# Altium footprint library ParsaLibrary.PcbLib: 526 footprints (part 4 of 33)
Each footprint in its own frame and in the unit in brackets; x right, y up, seen from the top. Pads: shape width x height; smd on the part's side, far side on the other; paste and mask are expansions set on the pad; w line width, h text height; cw(c..) or ccw(c..) is an arc to the next point about the centre after c.
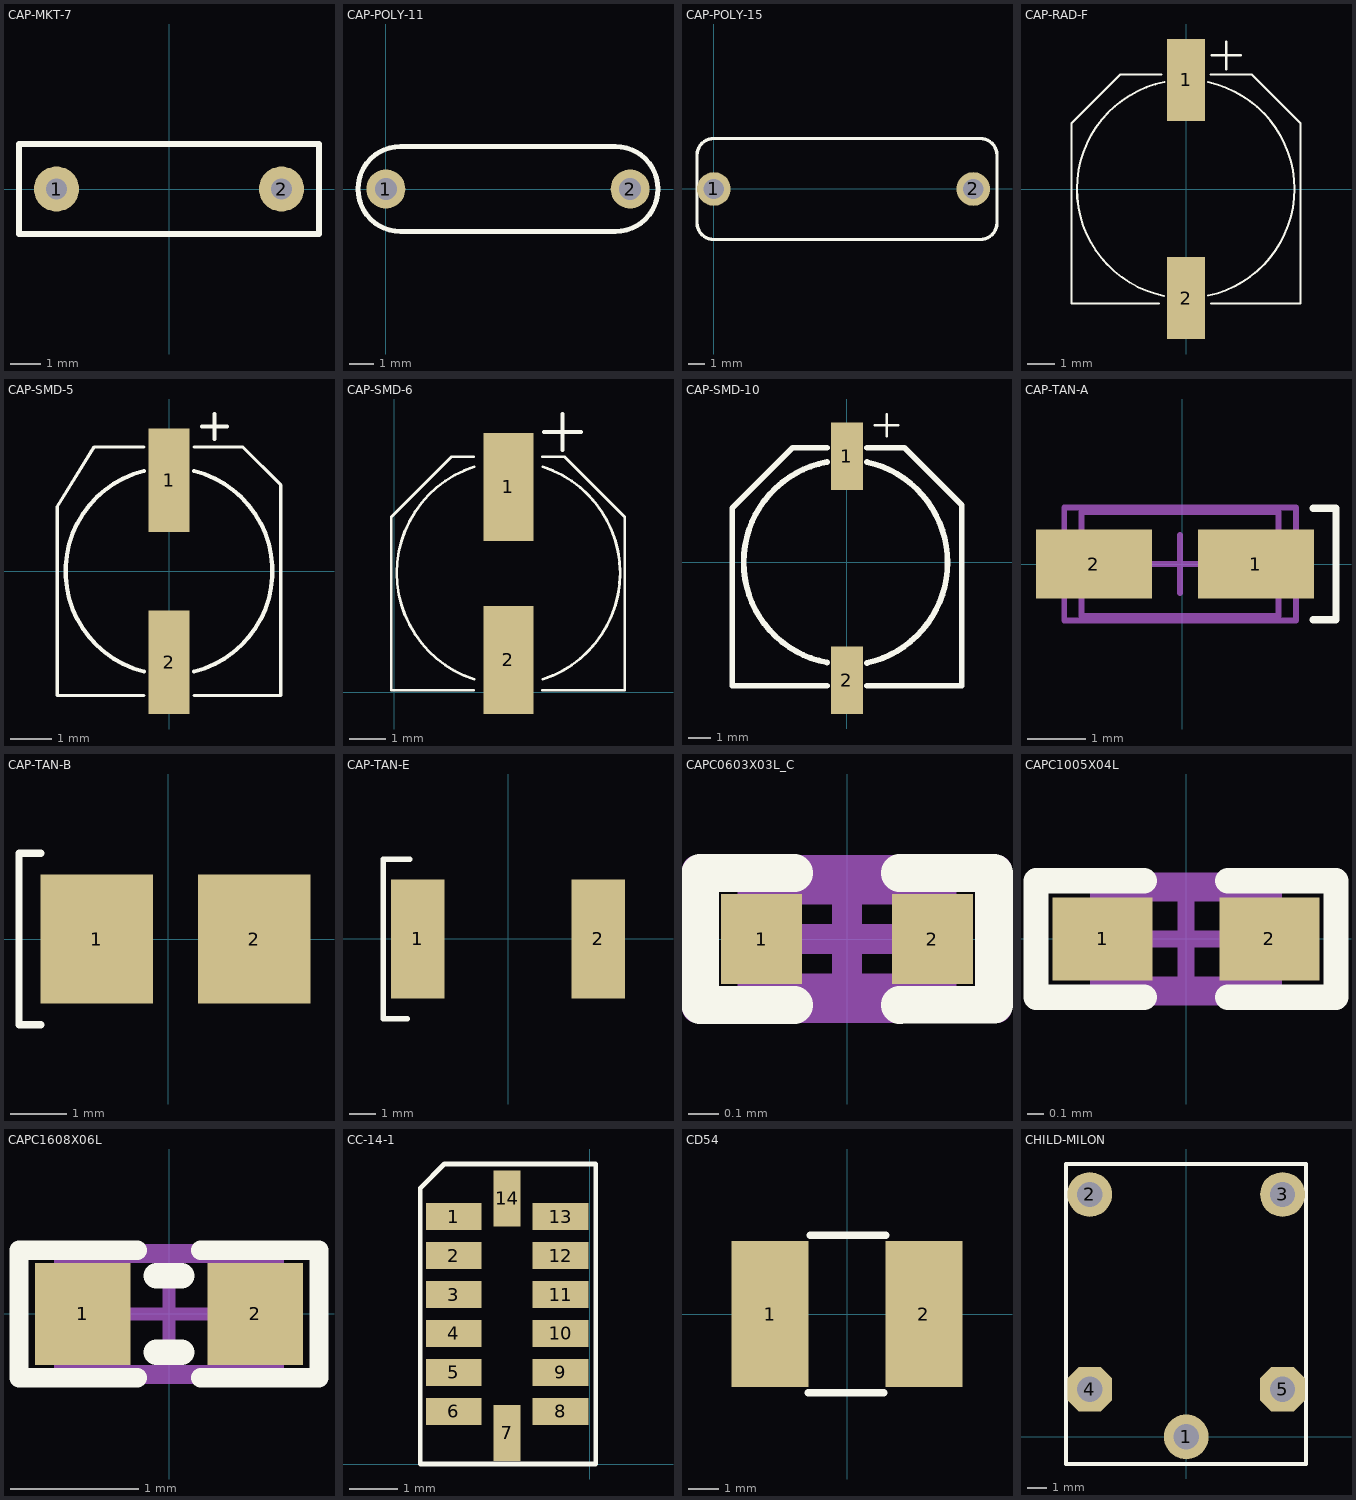
[diagram p3: the footprints below, top view; thin cyan lines are the x and y axes]

## CAP-MKT-7 [mm]
pads (2):
  round 1.5 hole 0.7: 1(-3.75,0) 2(3.75,0)
Top Overlay:
  lines w0.2: -5,-1.5 -5,1.5 5,1.5 5,-1.5 -5,-1.5
3D body: height 8, standoff 0, extent -5,-1.5 5,1.5

## CAP-POLY-11 [mm]
pads (2):
  round 1.6 hole 0.9: 1(0,0) 2(10,0)
Top Overlay:
  lines w0.2: 0.6,-1.738 cw(c0.6,0) 0.6,1.738 9.4,1.738 cw(c9.4,0) 9.4,-1.738 0.6,-1.738
3D body "__-6.STEP": height 11, standoff -3, extent -0.5,-1.75 10.5,1.75

## CAP-POLY-15 [mm]
pads (2):
  round 2 hole 1.2: 1(0,0) 2(15.4,0)
Top Overlay:
  lines w0.2: 15.811,-3.001 ccw(c15.811,-2.001) 16.811,-2.001 16.811,1.999 ccw(c15.811,1.999) 15.811,2.999 ; 15.811,-3 0,-3 cw(c0,-2) -1,-2 -1,2 cw(c0,2) 0,3 15.811,3
3D body "Part1.STEP": height 11, standoff -3, extent -0.403,-2.895 15.997,2.905

## CAP-RAD-F [mil]
pads (2):
  rect 55x118 smd: 1(0,157.48) 2(0,-157.48)
Top Overlay:
  lines w3: -38.98,-165.35 -165.35,-165.35 -165.35,94.49 -94.49,165.35 -35.43,165.35 ; -31.64,-154.27 cw(c0,0) -30.88,154.42 ; 31.59,-154 ccw(c-0.98,0.08) 31.62,154.15 ; 35.43,165.35 94.49,165.35 165.35,94.49 165.35,-165.35 36.02,-165.35
  lines w3.94: 37.4,192.91 78.74,192.91 ; 58.07,173.23 58.07,212.6
3D body "User Library-capacitor size F.step": height 401.77, standoff -0.2, extent -163.39,-194.89 163.38,194.88

## CAP-SMD-5 [mm]
pads (2):
  rect 1x2.5 smd: 1(0,2.2) 2(0,-2.2)
Top Overlay:
  lines w0.076: -0.6,-3 -2.7,-3 -2.7,1.562 ; -0.6,3 -1.813,3 ; 0.6,-3 2.7,-3 2.7,2.088 ; 0.6,3 1.788,3 ; -2.7,1.562 -1.813,3 ; -2.7,1.562 -1.813,3 ; 1.788,3 2.7,2.088 ; 1.788,3 2.7,2.088
  lines w0.1: -0.606,-2.425 cw(c0,0) -0.606,2.425 ; 0.606,-2.425 ccw(c0,0) 0.606,2.425 ; 0.8,3.5 1.4,3.5 ; 1.1,3.2 1.1,3.8
3D body "User Library-CAP SMD SVP 5_0x5_9.STEP": height 5.9, standoff 0, extent -2.65,-3 2.65,3

## CAP-SMD-6 [mil]
pads (2):
  rect 55x118 smd: 1(125,224) 2(125,35)
Top Overlay:
  lines w3: 87,2 -3,2 ; 87,257 63,257 ; 87.6,13.87 cw(c125,130) 87.6,246.13 ; 162,2 252,2 ; 162,257 186,257 ; 162.4,13.87 ccw(c125,130) 162.4,246.13 ; -3,2 -3,191 ; -3,2 -3,191 ; -3,191 63,257 ; -3,191 63,257 ; 186,257 252,191 ; 186,257 252,191 ; 252,2 252,191 ; 252,2 252,191
  lines w3.94: 163.39,284.02 204.72,284.02 ; 184.06,264.33 184.06,303.7
3D body "CAP-POL6.STEP": height 215.27, standoff 0.31, extent 5,-9.6 243.19,269.6

## CAP-SMD-10 [mil]
pads (2):
  rect 55x118 smd: 1(0,185) 2(0,-205)
Top Overlay:
  lines w3.94: 48.39,239.02 89.72,239.02 ; 69.06,219.33 69.06,258.7
  lines w10: -35,-215 -200,-215 -200,95 -95,200 -35,200 ; -35,175 ccw(c-2.51,0.43) -34.85,-174.17 ; 35,-215 200,-215 200,100 100,200 35,200 ; 35,-175 ccw(c-4.02,0) 35,175
3D body "NICHICON_UWT1H221MNL1GS.STEP": height 401.63, standoff 0, extent -200.52,-224.14 204.99,204.99

## CAP-TAN-A [mm] "Chip Capacitor, 2-Leads, Body 3.2x1.6mm, IPC High Density, chip Tantalum"
height 1.8
pads (2):
  rect 1.999x1.199 smd: 1(1.27,0) 2(-1.53,0)
Top Overlay:
  lines w0.127: 2.258,-0.965 2.652,-0.965 2.652,0.965 2.258,0.965
Mechanical 13:
  lines w0.1: -1.741,-0.9 1.659,-0.9 1.659,0.9 -1.741,0.9 -1.741,-0.9
Mechanical 15:
  lines w0.1: -0.541,0 0.459,0 ; -0.041,-0.5 -0.041,0.5 ; -2.041,-0.975 -2.041,0.975 1.959,0.975 1.959,-0.975 -2.041,-0.975
3D body "SW3dPS-Solid Tantalum Chip Capacitor Size (A-3216-18).STEP": height 1.8, standoff 0, extent -1.94,-0.902 1.699,0.902

## CAP-TAN-B [mm]
pads (2):
  rect 2x2.3 smd: 1(-1.27,0)
  rect 1.999x2.3 smd: 2(1.53,0)
Top Overlay:
  lines w0.127: -2.258,-1.524 -2.651,-1.524 -2.651,1.524 -2.258,1.524
3D body "User Library-AVX_BCASE.step": height 2.03, standoff 0, extent -1.85,-1.465 1.85,1.465

## CAP-TAN-E [mm]
pads (2):
  rect 2x4.5 smd: 1(-3.4,0) 2(3.4,0)
Top Overlay:
  lines w0.2: -3.8,-3 -4.7,-3 -4.7,3 -3.7,3
3D body "User Library-CaseE_7260-38.step": height 3.6, standoff 0, extent -3.65,-3 3.65,3

## CAPC0603X03L_C [mm]
pads (2):
  rect 0.27x0.3 smd: 1(-0.285,0) 2(0.285,0)
Top Overlay:
  lines w0.125: -0.175,-0.22 -0.49,-0.22 -0.49,0.22 -0.175,0.22 ; 0.175,-0.22 0.49,-0.22 0.49,0.22 0.175,0.22
Mechanical 7:
  lines w0.1: -0.315,-0.165 0.315,-0.165 0.315,0.165 -0.315,0.165 -0.315,-0.165
  text ".Designator" at -0.306,0.268 h0.3
Mechanical 15:
  lines w0.1: -0.165,0 0.165,0 ; 0,-0.165 0,0.165 ; -0.5,-0.23 0.5,-0.23 0.5,0.23 -0.5,0.23 -0.5,-0.23
3D body "User Library-0201(0603M) Cap.step": height 0.3, standoff -0.01, extent -0.305,-0.152 0.305,0.153

## CAPC1005X04L [mm]
pads (2):
  rect 0.6x0.5 smd: 1(-0.5,0) 2(0.5,0)
Top Overlay:
  lines w0.152: -0.25,-0.35 -0.9,-0.35 -0.9,0.35 -0.25,0.35 ; 0.25,-0.35 0.9,-0.35 0.9,0.35 0.25,0.35
Mechanical 7:
  lines w0.1: -0.525,-0.275 -0.525,0.275 0.525,0.275 0.525,-0.275 -0.525,-0.275
  text ".Designator" at -0.432,-0.152 h0.3
Mechanical 15:
  lines w0.1: -0.275,0 0.275,0 ; 0,-0.275 0,0.275 ; -0.9,-0.35 0.9,-0.35 0.9,0.35 -0.9,0.35 -0.9,-0.35
3D body "User Library-0402(1005M) Cap.step": height 0.5, standoff -0.01, extent -0.508,-0.254 0.508,0.254

## CAPC1608X06L [mm]
pads (2):
  rect 0.75x0.8 smd: 1(-0.675,0) 2(0.675,0)
Top Overlay:
  lines w0.152: -0.25,-0.5 -1.175,-0.5 -1.175,0.5 -0.25,0.5 ; 0.25,-0.5 1.175,-0.5 1.175,0.5 0.25,0.5
  lines w0.2: -0.1,-0.3 0.1,-0.3 ; -0.1,0.3 0.1,0.3
Mechanical 7:
  lines w0.1: -0.85,-0.45 0.85,-0.45 0.85,0.45 -0.85,0.45 -0.85,-0.45
  text ".Designator" at -0.685,-0.142 h0.38
Mechanical 15:
  lines w0.1: -0.45,0 0.45,0 ; 0,-0.45 0,0.45 ; -1.175,-0.5 -1.175,0.5 1.175,0.5 1.175,-0.5 -1.175,-0.5
3D body "User Library-Chip Capacitor 0603.step": height 0.8, standoff 0, extent -0.8,-0.43 0.8,0.43

## CC-14-1 [mm]
height 1
pads (14):
  rect 1.145x0.55 smd: 1(-2.794,5.08) 2(-2.794,4.28) 3(-2.794,3.48) 4(-2.794,2.68) 5(-2.794,1.88) 6(-2.794,1.08) 8(-0.599,1.08) 9(-0.599,1.88) 10(-0.599,2.68) 11(-0.599,3.48) 12(-0.599,4.28) 13(-0.599,5.08)
  rect 0.55x1.145 smd: 7(-1.696,0.639) 14(-1.696,5.454)
Top Overlay:
  lines w0.1: -3.478,0 0.122,0 0.122,6.159 -2.984,6.159 -3.478,5.666 -3.478,0
3D body "User Library-ADXL345.step": height 1, standoff 0, extent -3.196,0.573 -0.196,5.573

## CD54 [mil]
pads (2):
  rect 100x190 smd: 1(-100,0) 2(100,0)
Top Overlay:
  lines w10: -50,-102.36 47.64,-102.36 ; -47.64,102.36 50,102.36
3D body "User Library-CD54.step": height 177.17, standoff 0, extent -117.92,-102.36 115,102.36

## CHILD-MILON [mm]
height 13.1
pads (5):
  round 2.3 hole 1.3: 1(0,0) 2(-4.95,12.45) 3(4.95,12.45)
  oct 2.3x2.3 hole 1.3: 4(-4.95,2.45) 5(4.95,2.45)
Top Overlay:
  lines w0.2: -6.176,-1.394 -6.176,14.014 6.157,14.014 6.157,-1.394 -6.176,-1.394
3D body "relay.STEP": height 15.6, standoff -2, extent -6.05,-1.3 6.05,14